# Altium footprint library My Library.PcbLib: 872 footprints (part 8 of 55)
Each footprint in its own frame and in the unit in brackets; x right, y up, seen from the top. Pads: shape width x height; smd on the part's side, far side on the other; paste and mask are expansions set on the pad; w line width, h text height; cw(c..) or ccw(c..) is an arc to the next point about the centre after c.
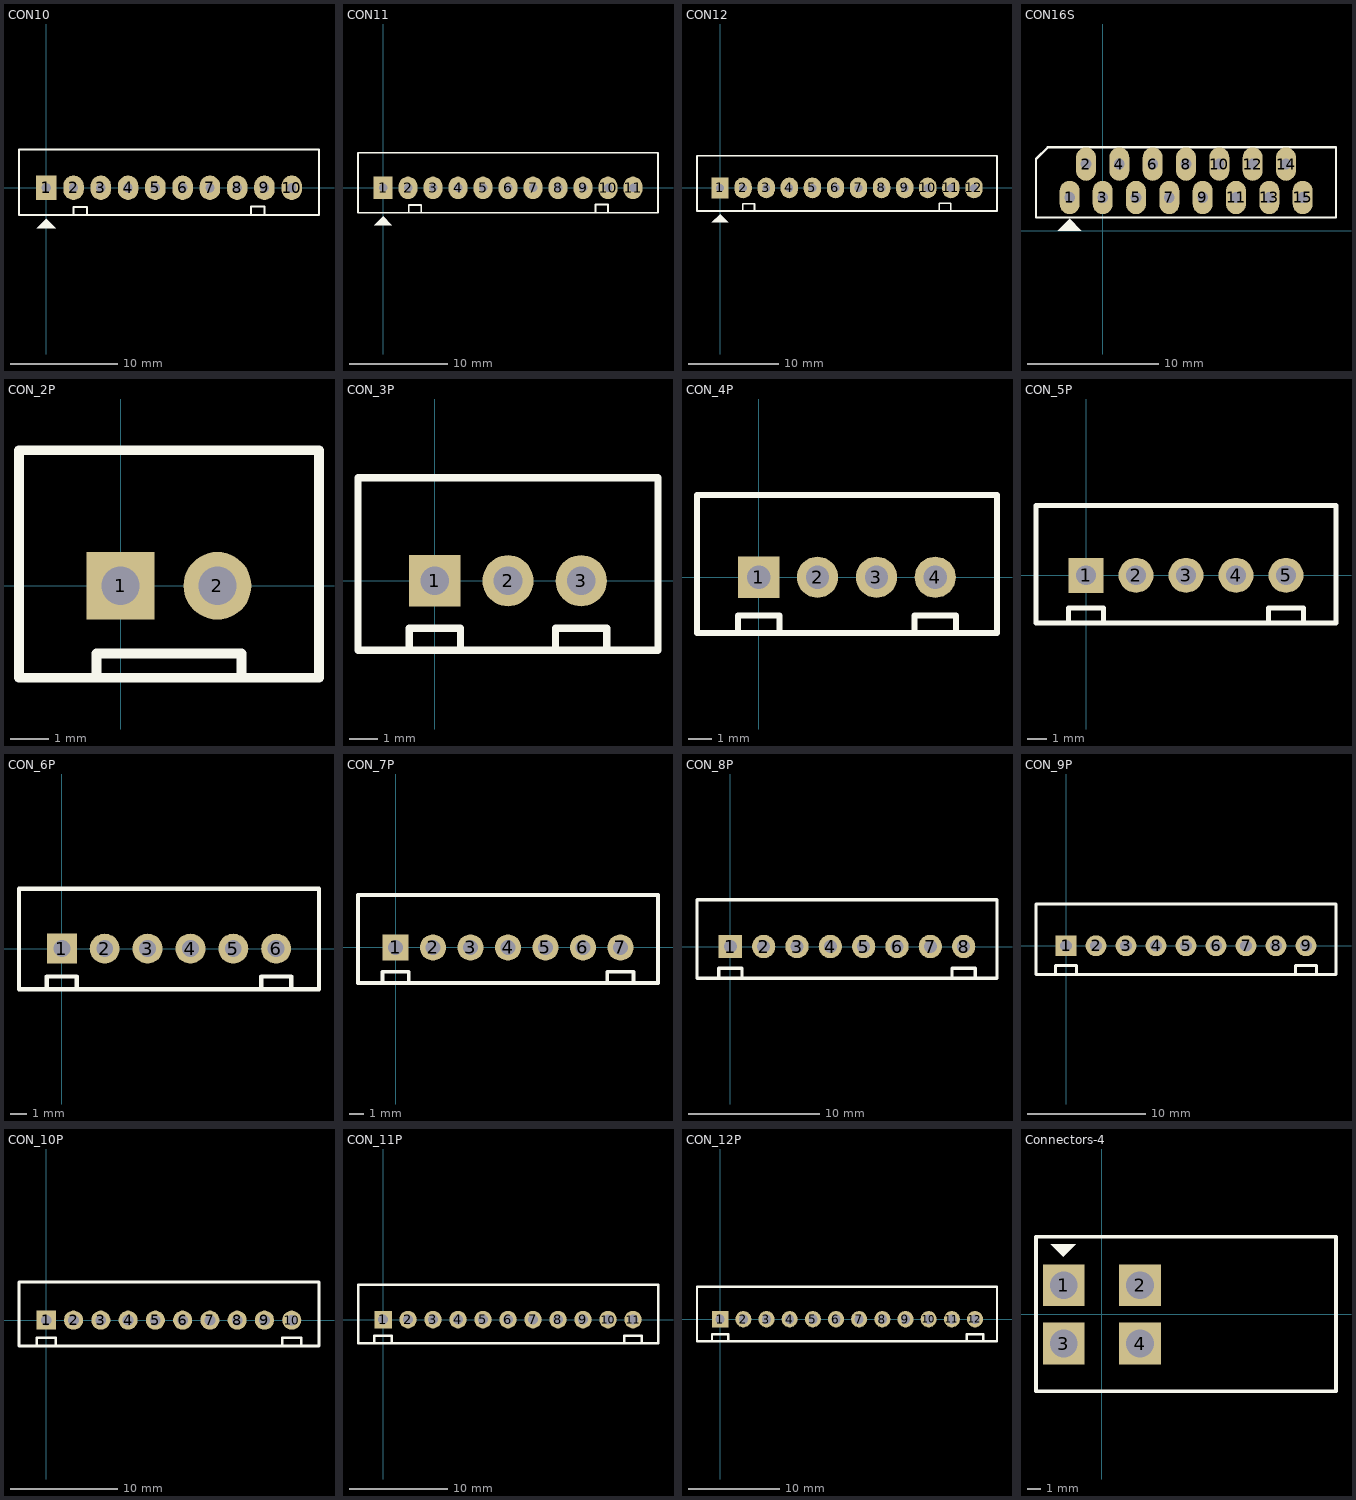
[diagram p7: the footprints below, top view; thin cyan lines are the x and y axes]

## CON10 [mil] "CON10"
height 200
pads (10):
  rect 75x90 hole 34: 1(0,0)
  oval 75x90 hole 34: 2(100,0) 3(200,0) 4(300,0) 5(400,0) 6(500,0) 7(600,0) 8(700,0) 9(800,0) 10(900,0)
Top Overlay:
  region: -35.5,-149.5 35.5,-149.5 0.5,-114.5 0.5,-113.5
  lines w7: 100,-100 100,-70 150,-70 150,-100 ; 750,-99 750,-69 800,-69 800,-99 ; -100,-100 -100,140 1000,140 1000,0 1000,-100 -100,-100

## CON11 [mil] "CON11"
height 200
pads (11):
  rect 75x90 hole 34: 1(0,0)
  oval 75x90 hole 34: 2(100,0) 3(200,0) 4(300,0) 5(400,0) 6(500,0) 7(600,0) 8(700,0) 9(800,0) 10(900,0) 11(1000,0)
Top Overlay:
  region: -35.5,-149.5 35.5,-149.5 0.5,-114.5 0.5,-113.5
  lines w7: 103,-99 103,-69 153,-69 153,-99 ; 850,-97 850,-67 900,-67 900,-97 ; -100,-100 -100,140 1100,140 1100,0 1100,-100 -100,-100

## CON12 [mil] "CON12"
height 200
pads (12):
  rect 75x90 hole 34: 1(0,0)
  oval 75x90 hole 34: 2(100,0) 3(200,0) 4(300,0) 5(400,0) 6(500,0) 7(600,0) 8(700,0) 9(800,0) 10(900,0) 11(1000,0) 12(1100,0)
Top Overlay:
  region: -35.5,-149.5 35.5,-149.5 0.5,-114.5 0.5,-113.5
  lines w7: 99,-99 99,-69 149,-69 149,-99 ; 950,-97 950,-67 1000,-67 1000,-97 ; -100,-100 -100,140 1200,140 1200,0 1200,-100 -100,-100

## CON16S [mil] "Jam 16S"
pads (15):
  oval 60x100 hole 32: 1(-99,100) 2(-50,200) 3(0,100) 4(50,200) 5(100,100) 6(150,200) 7(200,100) 8(250,200) 9(300,100) 10(350,200) 11(400,100) 12(450,200) 13(500,100) 14(550,200) 15(600,100)
Top Overlay:
  region: -135.5,0.5 -64.5,0.5 -99.5,35.5 -99.5,36.5
  lines w7: -200,40 700,40 700,250 -165,250 -200,215 -200,40

## CON_2P [mil]
pads (2):
  rect 70x70 hole 39.37 unplated: 1(0,0)
  round 70 hole 39.37 unplated: 2(100,0)
Top Overlay:
  lines w10: -25,-95 -25,-70 125,-70 125,-95 ; -105,-95 -105,140 205,140 205,-95 -105,-95
3D body "User Library-PW10-XX-M whitePW10-2M.STEP": height 275.59, standoff -129.92, extent -97.64,-90 197.64,134.41

## CON_3P [mil]
pads (3):
  rect 70x70 hole 39.37 unplated: 1(0,0)
  round 70 hole 39.37 unplated: 2(100,0) 3(200,0)
Top Overlay:
  lines w10: -35,-95 -35,-65 35,-65 35,-95 ; 165,-95 165,-65 235,-65 235,-95 ; -105,-95 -105,141 305,141 305,-95 -105,-95
3D body "User Library-PW10-XX-M whitePW10-3M.STEP": height 275.59, standoff -129.92, extent -96.85,-90 296.85,134.41

## CON_4P [mil]
pads (4):
  rect 70x70 hole 39.37 unplated: 1(0,0)
  round 70 hole 39.37 unplated: 2(100,0) 3(200,0)
  round 70 hole 39.37 unplated mask+4: 4(300,0)
Top Overlay:
  lines w10: -35,-95 -35,-65 35,-65 35,-95 ; 265,-95 265,-65 335,-65 335,-95 ; -105,-95 405,-95 405,140 -105,140 -105,-95
3D body "User Library-PW10-XX-M whitePW10-4M.STEP": height 275.59, standoff -129.92, extent -96.06,-90 396.07,134.41

## CON_5P [mil]
pads (5):
  rect 70x70 hole 39.37 unplated: 1(0,0)
  round 70 hole 39.37 unplated: 2(100,0) 3(200,0)
  round 70 hole 39.37 unplated mask+4: 4(300,0) 5(400,0)
Top Overlay:
  lines w10: -35,-95 -35,-65 35,-65 35,-95 ; 365,-95 365,-65 435,-65 435,-95 ; -100,-95 500,-95 500,140 -100,140 -100,-95
3D body "User Library-PW10-XX-M whitePW10-5M.STEP": height 275.59, standoff -129.92, extent -95.28,-90 495.28,134.41

## CON_6P [mil]
pads (6):
  rect 70x70 hole 39.37 unplated: 1(0,0)
  round 70 hole 39.37 unplated: 2(100,0) 3(200,0)
  round 70 hole 39.37 unplated mask+4: 4(300,0) 5(400,0) 6(500,0)
Top Overlay:
  lines w10: -35,-95 -35,-65 35,-65 35,-95 ; 465,-95 465,-65 535,-65 535,-95 ; -100,-95 -100,140 600,140 600,-95 -100,-95
3D body "User Library-PW10-XX-M whitePW10-6M.STEP": height 275.59, standoff -129.92, extent -94.49,-90 594.49,134.41

## CON_7P [mil]
pads (7):
  rect 70x70 hole 39.37 unplated: 1(0,0)
  round 70 hole 39.37 unplated: 2(100,0) 3(200,0)
  round 70 hole 39.37 unplated mask+4: 4(300,0) 5(400,0) 6(500,0) 7(600,0)
Top Overlay:
  lines w10: -35,-95 -35,-65 35,-65 35,-95 ; 565,-95 565,-65 635,-65 635,-95 ; -100,-95 -100,140 700,140 700,-95 -100,-95
3D body "User Library-PW10-XX-M whitePW10-7M.STEP": height 275.59, standoff -129.92, extent -95.67,-90 695.67,134.41

## CON_8P [mil]
pads (8):
  rect 70x70 hole 39.37 unplated: 1(0,0)
  round 70 hole 39.37 unplated: 2(100,0) 3(200,0)
  round 70 hole 39.37 unplated mask+4: 4(300,0) 5(400,0) 6(500,0) 7(600,0) 8(700,0)
Top Overlay:
  lines w10: -35,-95 -35,-65 35,-65 35,-95 ; 665,-95 665,-65 735,-65 735,-95 ; -100,-95 800,-95 800,140 -100,140 -100,-95
3D body "User Library-PW10-XX-M whitePW10-8M.STEP": height 275.59, standoff -129.92, extent -94.88,-90 794.89,134.41

## CON_9P [mil]
pads (9):
  rect 70x70 hole 39.37 unplated: 1(0,0)
  round 70 hole 39.37 unplated: 2(100,0) 3(200,0)
  round 70 hole 39.37 unplated mask+4: 4(300,0) 5(400,0) 6(500,0) 7(600,0) 8(700,0) 9(800,0)
Top Overlay:
  lines w10: -35,-95 -35,-65 35,-65 35,-95 ; 765,-95 765,-65 835,-65 835,-95 ; -100,-95 900,-95 900,140 -100,140 -100,-95
3D body "User Library-PW10-XX-M whitePW10-9M.STEP": height 275.59, standoff -129.92, extent -94.1,-90 894.1,134.41

## CON_10P [mil]
pads (10):
  rect 70x70 hole 39.37 unplated: 1(0,0)
  round 70 hole 39.37 unplated: 2(100,0) 3(200,0)
  round 70 hole 39.37 unplated mask+4: 4(300,0) 5(400,0) 6(500,0) 7(600,0) 8(700,0) 9(800,0) 10(900,0)
Top Overlay:
  lines w10: -35,-95 -35,-65 35,-65 35,-95 ; 865,-95 865,-65 935,-65 935,-95 ; -100,-95 -100,140 1000,140 1000,-95 -100,-95
3D body "User Library-PW10-XX-M whitePW10-10M.STEP": height 275.59, standoff -129.92, extent -93.3,-90 993.31,134.41

## CON_11P [mil]
pads (11):
  rect 70x70 hole 39.37 unplated: 1(0,0)
  round 70 hole 39.37 unplated: 2(100,0) 3(200,0)
  round 70 hole 39.37 unplated mask+4: 4(300,0) 5(400,0) 6(500,0) 7(600,0) 8(700,0) 9(800,0) 10(900,0) 11(1000,0)
Top Overlay:
  lines w10: -35,-95 -35,-65 35,-65 35,-95 ; 965,-95 965,-65 1035,-65 1035,-95 ; -100,-95 -100,140 1100,140 1100,-95 -100,-95
3D body "User Library-PW10-XX-M whitePW10-11M.STEP": height 275.59, standoff -129.92, extent -92.52,-90 1092.52,134.41

## CON_12P [mil]
pads (12):
  rect 70x70 hole 39.37 unplated: 1(0,0)
  round 70 hole 39.37 unplated: 2(100,0) 3(200,0)
  round 70 hole 39.37 unplated mask+4: 4(300,0) 5(400,0) 6(500,0) 7(600,0) 8(700,0) 9(800,0) 10(900,0) 11(1000,0) 12(1100,0)
Top Overlay:
  lines w10: -35,-95 -35,-65 35,-65 35,-95 ; 1065,-95 1065,-65 1135,-65 1135,-95 ; -100,-95 -100,140 1195,140 1195,-95 -100,-95
3D body "User Library-PW10-XX-M whitePW10-12M.STEP": height 275.59, standoff -129.92, extent -91.73,-90 1191.73,134.41

## Connectors-4 [mm]
pads (4):
  rect 3x3 hole 2: 1(-2.75,2.1) 2(2.75,2.1) 3(-2.75,-2.1) 4(2.75,-2.1)
Top Overlay:
  region: -1.892,5.067 -3.696,5.067 -2.807,4.178 -2.807,4.153
  lines w0.254: -4.759,-5.557 16.9,-5.557 16.9,5.617 -4.759,5.617 -4.759,-5.557
3D body: height 10.2, standoff 0, extent 3.873,-5.277 17.027,5.227
3D body: height 11.2, standoff 10.2, extent 13.818,-1.543 16.917,1.656
3D body: height 3.5, standoff 2.5, extent 2.032,-2.906 4.75,-1.382
3D body: height 7.7, standoff 6.7, extent -3.454,-2.906 5.817,-1.382
3D body: height 7.7, standoff -1, extent -3.454,-2.906 -2.083,-1.382
3D body: height 3.5, standoff 0, extent 2.057,-2.906 3.454,-1.382
3D body: height 3.5, standoff 0, extent 2.057,1.294 3.454,2.818
3D body: height 7.7, standoff -1, extent -3.454,1.294 -2.083,2.818
3D body: height 7.7, standoff 6.7, extent -3.454,1.294 5.817,2.818
3D body: height 3.5, standoff 2.5, extent 2.032,1.294 4.75,2.818